# Altium footprint library Connector_PinHeader_2.00mm.PcbLib: 278 footprints (part 14 of 18)
Each footprint in its own frame and in the unit in brackets; x right, y up, seen from the top. Pads: shape width x height; smd on the part's side, far side on the other; paste and mask are expansions set on the pad; w line width, h text height; cw(c..) or ccw(c..) is an arc to the next point about the centre after c.
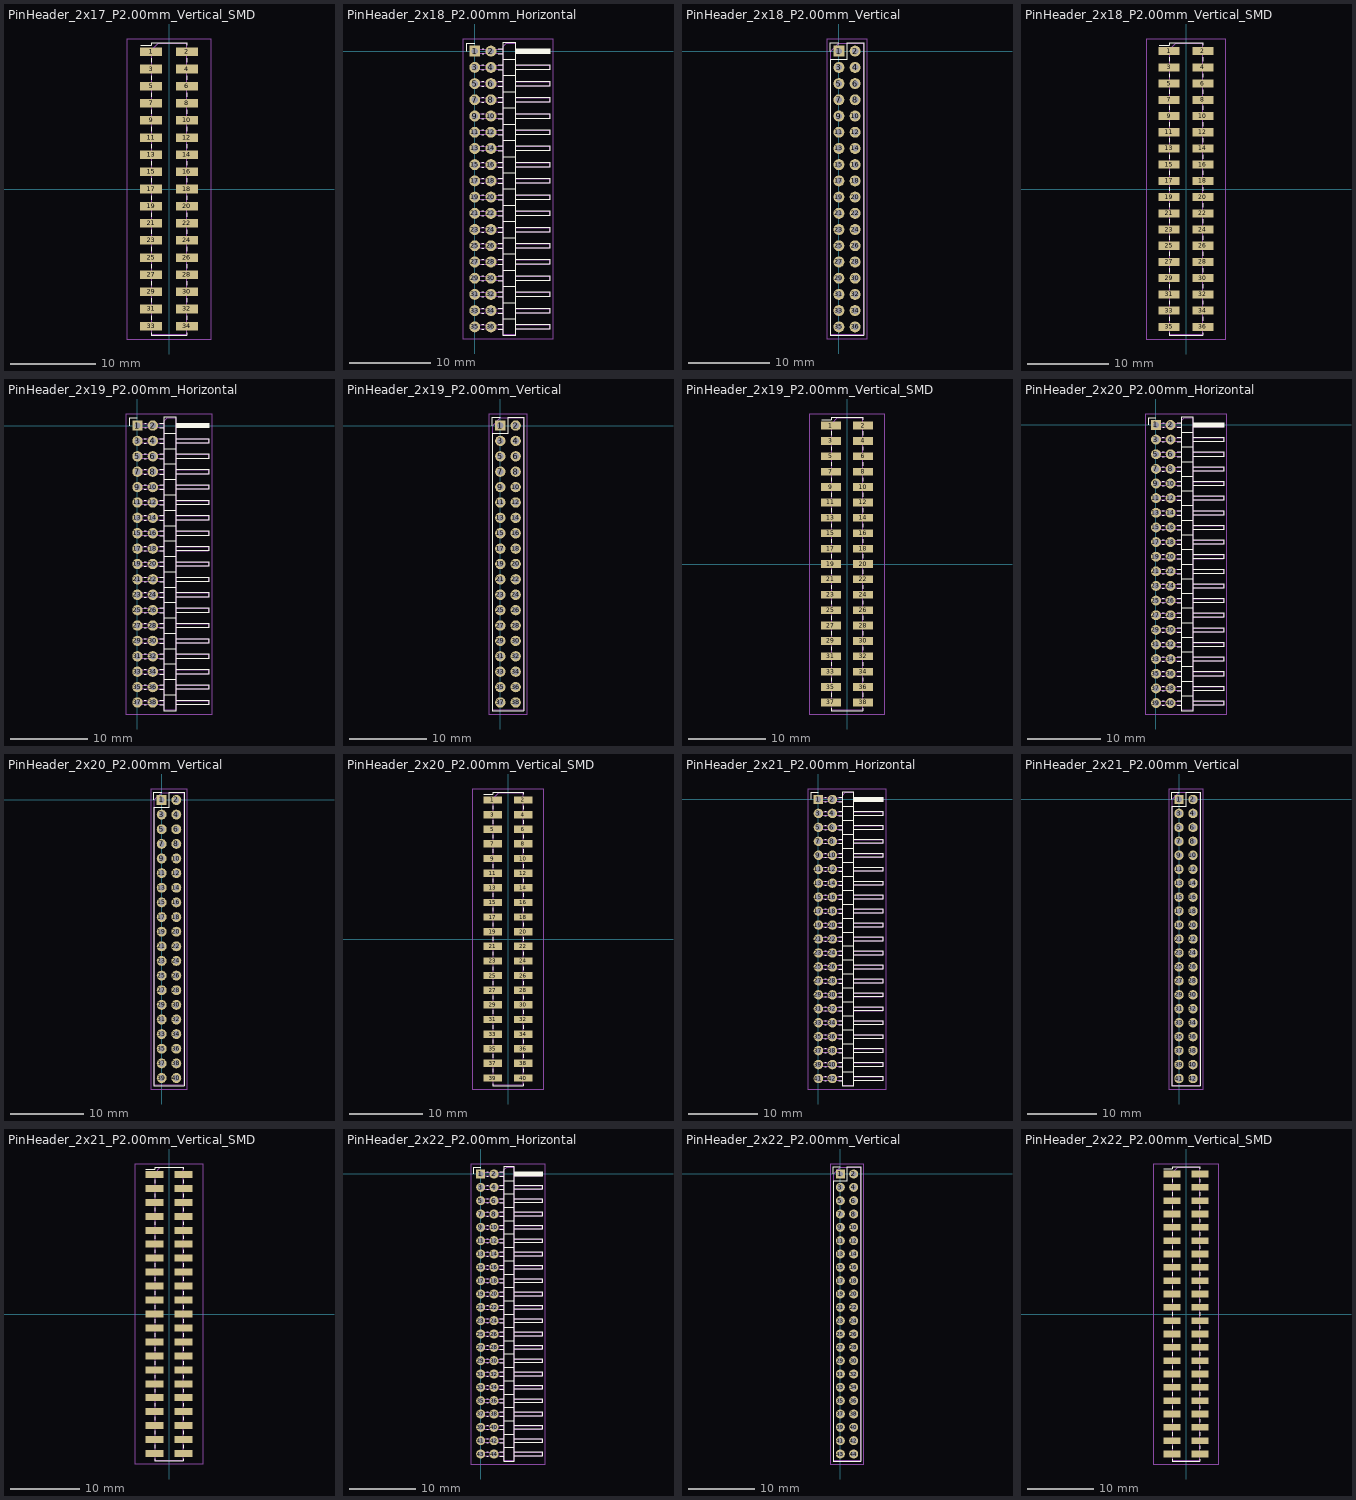
[diagram p13: the footprints below, top view; thin cyan lines are the x and y axes]

## PinHeader_2x17_P2.00mm_Vertical_SMD [mm]
pads (34):
  rect 2.58x1 smd: 1(-2.085,16) 2(2.085,16) 3(-2.085,14) 4(2.085,14) 5(-2.085,12) 6(2.085,12) 7(-2.085,10) 8(2.085,10) 9(-2.085,8) 10(2.085,8) 11(-2.085,6) 12(2.085,6) 13(-2.085,4) 14(2.085,4) 15(-2.085,2) 16(2.085,2) 17(-2.085,0) 18(2.085,0) 19(-2.085,-2) 20(2.085,-2) 21(-2.085,-4) 22(2.085,-4) 23(-2.085,-6) 24(2.085,-6) 25(-2.085,-8) 26(2.085,-8) 27(-2.085,-10) 28(2.085,-10) 29(-2.085,-12) 30(2.085,-12) 31(-2.085,-14) 32(2.085,-14) 33(-2.085,-16) 34(2.085,-16)
F.SilkS:
  lines w0.12: -3.315,16.76 -2.06,16.76 -2.06,17.06 2.06,17.06 2.06,16.76 ; -2.06,-16.76 -2.06,-17.06 2.06,-17.06 2.06,-16.76 ; -2.06,-15.24 -2.06,-14.76 ; -2.06,-13.24 -2.06,-12.76 ; -2.06,-11.24 -2.06,-10.76 ; -2.06,-9.24 -2.06,-8.76 ; -2.06,-7.24 -2.06,-6.76 ; -2.06,-5.24 -2.06,-4.76 ; -2.06,-3.24 -2.06,-2.76 ; -2.06,-1.24 -2.06,-0.76 ; -2.06,0.76 -2.06,1.24 ; -2.06,2.76 -2.06,3.24 ; -2.06,4.76 -2.06,5.24 ; -2.06,6.76 -2.06,7.24 ; -2.06,8.76 -2.06,9.24 ; -2.06,10.76 -2.06,11.24 ; -2.06,12.76 -2.06,13.24 ; -2.06,14.76 -2.06,15.24 ; 2.06,-15.24 2.06,-14.76 ; 2.06,-13.24 2.06,-12.76 ; 2.06,-11.24 2.06,-10.76 ; 2.06,-9.24 2.06,-8.76 ; 2.06,-7.24 2.06,-6.76 ; 2.06,-5.24 2.06,-4.76 ; 2.06,-3.24 2.06,-2.76 ; 2.06,-1.24 2.06,-0.76 ; 2.06,0.76 2.06,1.24 ; 2.06,2.76 2.06,3.24 ; 2.06,4.76 2.06,5.24 ; 2.06,6.76 2.06,7.24 ; 2.06,8.76 2.06,9.24 ; 2.06,10.76 2.06,11.24 ; 2.06,12.76 2.06,13.24 ; 2.06,14.76 2.06,15.24
F.CrtYd:
  lines w0.05: -4.9,-17.5 4.9,-17.5 4.9,17.5 -4.9,17.5 -4.9,-17.5
F.Fab:
  lines w0.1: -2,-16.25 -2.875,-16.25 -2.875,-15.75 -2,-15.75 ; -2,-14.25 -2.875,-14.25 -2.875,-13.75 -2,-13.75 ; -2,-12.25 -2.875,-12.25 -2.875,-11.75 -2,-11.75 ; -2,-10.25 -2.875,-10.25 -2.875,-9.75 -2,-9.75 ; -2,-8.25 -2.875,-8.25 -2.875,-7.75 -2,-7.75 ; -2,-6.25 -2.875,-6.25 -2.875,-5.75 -2,-5.75 ; -2,-4.25 -2.875,-4.25 -2.875,-3.75 -2,-3.75 ; -2,-2.25 -2.875,-2.25 -2.875,-1.75 -2,-1.75 ; -2,-0.25 -2.875,-0.25 -2.875,0.25 -2,0.25 ; -2,1.75 -2.875,1.75 -2.875,2.25 -2,2.25 ; -2,3.75 -2.875,3.75 -2.875,4.25 -2,4.25 ; -2,5.75 -2.875,5.75 -2.875,6.25 -2,6.25 ; -2,7.75 -2.875,7.75 -2.875,8.25 -2,8.25 ; -2,9.75 -2.875,9.75 -2.875,10.25 -2,10.25 ; -2,11.75 -2.875,11.75 -2.875,12.25 -2,12.25 ; -2,13.75 -2.875,13.75 -2.875,14.25 -2,14.25 ; -2,15.75 -2.875,15.75 -2.875,16.25 -2,16.25 ; 2,-16.25 2.875,-16.25 2.875,-15.75 2,-15.75 ; 2,-14.25 2.875,-14.25 2.875,-13.75 2,-13.75 ; 2,-12.25 2.875,-12.25 2.875,-11.75 2,-11.75 ; 2,-10.25 2.875,-10.25 2.875,-9.75 2,-9.75 ; 2,-8.25 2.875,-8.25 2.875,-7.75 2,-7.75 ; 2,-6.25 2.875,-6.25 2.875,-5.75 2,-5.75 ; 2,-4.25 2.875,-4.25 2.875,-3.75 2,-3.75 ; 2,-2.25 2.875,-2.25 2.875,-1.75 2,-1.75 ; 2,-0.25 2.875,-0.25 2.875,0.25 2,0.25 ; 2,1.75 2.875,1.75 2.875,2.25 2,2.25 ; 2,3.75 2.875,3.75 2.875,4.25 2,4.25 ; 2,5.75 2.875,5.75 2.875,6.25 2,6.25 ; 2,7.75 2.875,7.75 2.875,8.25 2,8.25 ; 2,9.75 2.875,9.75 2.875,10.25 2,10.25 ; 2,11.75 2.875,11.75 2.875,12.25 2,12.25 ; 2,13.75 2.875,13.75 2.875,14.25 2,14.25 ; 2,15.75 2.875,15.75 2.875,16.25 2,16.25 ; -2,16.25 -2,-17 2,-17 2,17 -1.25,17 -2,16.25
  text "'.Designator'" at 0.84,-4.047 h1

## PinHeader_2x18_P2.00mm_Horizontal [mm]
pads (36):
  rect 1.35x1.35 hole 0.8: 1(0,0)
  rrect100% 1.35x1.35 hole 0.8: 2(2,0) 3(0,-2) 4(2,-2) 5(0,-4) 6(2,-4) 7(0,-6) 8(2,-6) 9(0,-8) 10(2,-8) 11(0,-10) 12(2,-10) 13(0,-12) 14(2,-12) 15(0,-14) 16(2,-14) 17(0,-16) 18(2,-16) 19(0,-18) 20(2,-18) 21(0,-20) 22(2,-20) 23(0,-22) 24(2,-22) 25(0,-24) 26(2,-24) 27(0,-26) 28(2,-26) 29(0,-28) 30(2,-28) 31(0,-30) 32(2,-30) 33(0,-32) 34(2,-32) 35(0,-34) 36(2,-34)
F.SilkS:
  drawing of 154 lines, arcs and shapes, not listed
F.CrtYd:
  lines w0.05: -1.5,-35.5 9.7,-35.5 9.7,1.5 -1.5,1.5 -1.5,-35.5
F.Fab:
  lines w0.1: 3.5,-34.25 -0.25,-34.25 -0.25,-33.75 3.5,-33.75 ; 3.5,-32.25 -0.25,-32.25 -0.25,-31.75 3.5,-31.75 ; 3.5,-30.25 -0.25,-30.25 -0.25,-29.75 3.5,-29.75 ; 3.5,-28.25 -0.25,-28.25 -0.25,-27.75 3.5,-27.75 ; 3.5,-26.25 -0.25,-26.25 -0.25,-25.75 3.5,-25.75 ; 3.5,-24.25 -0.25,-24.25 -0.25,-23.75 3.5,-23.75 ; 3.5,-22.25 -0.25,-22.25 -0.25,-21.75 3.5,-21.75 ; 3.5,-20.25 -0.25,-20.25 -0.25,-19.75 3.5,-19.75 ; 3.5,-18.25 -0.25,-18.25 -0.25,-17.75 3.5,-17.75 ; 3.5,-16.25 -0.25,-16.25 -0.25,-15.75 3.5,-15.75 ; 3.5,-14.25 -0.25,-14.25 -0.25,-13.75 3.5,-13.75 ; 3.5,-12.25 -0.25,-12.25 -0.25,-11.75 3.5,-11.75 ; 3.5,-10.25 -0.25,-10.25 -0.25,-9.75 3.5,-9.75 ; 3.5,-8.25 -0.25,-8.25 -0.25,-7.75 3.5,-7.75 ; 3.5,-6.25 -0.25,-6.25 -0.25,-5.75 3.5,-5.75 ; 3.5,-4.25 -0.25,-4.25 -0.25,-3.75 3.5,-3.75 ; 3.5,-2.25 -0.25,-2.25 -0.25,-1.75 3.5,-1.75 ; 3.5,-0.25 -0.25,-0.25 -0.25,0.25 3.5,0.25 ; 5,-34.25 9.2,-34.25 9.2,-33.75 5,-33.75 ; 5,-32.25 9.2,-32.25 9.2,-31.75 5,-31.75 ; 5,-30.25 9.2,-30.25 9.2,-29.75 5,-29.75 ; 5,-28.25 9.2,-28.25 9.2,-27.75 5,-27.75 ; 5,-26.25 9.2,-26.25 9.2,-25.75 5,-25.75 ; 5,-24.25 9.2,-24.25 9.2,-23.75 5,-23.75 ; 5,-22.25 9.2,-22.25 9.2,-21.75 5,-21.75 ; 5,-20.25 9.2,-20.25 9.2,-19.75 5,-19.75 ; 5,-18.25 9.2,-18.25 9.2,-17.75 5,-17.75 ; 5,-16.25 9.2,-16.25 9.2,-15.75 5,-15.75 ; 5,-14.25 9.2,-14.25 9.2,-13.75 5,-13.75 ; 5,-12.25 9.2,-12.25 9.2,-11.75 5,-11.75 ; 5,-10.25 9.2,-10.25 9.2,-9.75 5,-9.75 ; 5,-8.25 9.2,-8.25 9.2,-7.75 5,-7.75 ; 5,-6.25 9.2,-6.25 9.2,-5.75 5,-5.75 ; 5,-4.25 9.2,-4.25 9.2,-3.75 5,-3.75 ; 5,-2.25 9.2,-2.25 9.2,-1.75 5,-1.75 ; 5,-0.25 9.2,-0.25 9.2,0.25 5,0.25 ; 3.5,-35 3.5,0.625 3.875,1 5,1 5,-35 3.5,-35
  text "'.Designator'" at 5.006,-20.642 h0.9

## PinHeader_2x18_P2.00mm_Vertical [mm]
pads (36):
  rect 1.35x1.35 hole 0.8: 1(0,0)
  rrect100% 1.35x1.35 hole 0.8: 2(2,0) 3(0,-2) 4(2,-2) 5(0,-4) 6(2,-4) 7(0,-6) 8(2,-6) 9(0,-8) 10(2,-8) 11(0,-10) 12(2,-10) 13(0,-12) 14(2,-12) 15(0,-14) 16(2,-14) 17(0,-16) 18(2,-16) 19(0,-18) 20(2,-18) 21(0,-20) 22(2,-20) 23(0,-22) 24(2,-22) 25(0,-24) 26(2,-24) 27(0,-26) 28(2,-26) 29(0,-28) 30(2,-28) 31(0,-30) 32(2,-30) 33(0,-32) 34(2,-32) 35(0,-34) 36(2,-34)
F.SilkS:
  lines w0.12: -1.06,0 -1.06,1.06 0,1.06 ; -1.06,-35.06 3.06,-35.06 3.06,1.06 1,1.06 1,-1 -1.06,-1 -1.06,-35.06
F.CrtYd:
  lines w0.05: -1.5,-35.5 3.5,-35.5 3.5,1.5 -1.5,1.5 -1.5,-35.5
F.Fab:
  lines w0.1: -1,-35 3,-35 3,1 0,1 -1,0 -1,-35
  text "'.Designator'" at 1.84,-21.047 h1

## PinHeader_2x18_P2.00mm_Vertical_SMD [mm]
pads (36):
  rect 2.58x1 smd: 1(-2.085,17) 2(2.085,17) 3(-2.085,15) 4(2.085,15) 5(-2.085,13) 6(2.085,13) 7(-2.085,11) 8(2.085,11) 9(-2.085,9) 10(2.085,9) 11(-2.085,7) 12(2.085,7) 13(-2.085,5) 14(2.085,5) 15(-2.085,3) 16(2.085,3) 17(-2.085,1) 18(2.085,1) 19(-2.085,-1) 20(2.085,-1) 21(-2.085,-3) 22(2.085,-3) 23(-2.085,-5) 24(2.085,-5) 25(-2.085,-7) 26(2.085,-7) 27(-2.085,-9) 28(2.085,-9) 29(-2.085,-11) 30(2.085,-11) 31(-2.085,-13) 32(2.085,-13) 33(-2.085,-15) 34(2.085,-15) 35(-2.085,-17) 36(2.085,-17)
F.SilkS:
  lines w0.12: -3.315,17.76 -2.06,17.76 -2.06,18.06 2.06,18.06 2.06,17.76 ; -2.06,-17.76 -2.06,-18.06 2.06,-18.06 2.06,-17.76 ; -2.06,-16.24 -2.06,-15.76 ; -2.06,-14.24 -2.06,-13.76 ; -2.06,-12.24 -2.06,-11.76 ; -2.06,-10.24 -2.06,-9.76 ; -2.06,-8.24 -2.06,-7.76 ; -2.06,-6.24 -2.06,-5.76 ; -2.06,-4.24 -2.06,-3.76 ; -2.06,-2.24 -2.06,-1.76 ; -2.06,-0.24 -2.06,0.24 ; -2.06,1.76 -2.06,2.24 ; -2.06,3.76 -2.06,4.24 ; -2.06,5.76 -2.06,6.24 ; -2.06,7.76 -2.06,8.24 ; -2.06,9.76 -2.06,10.24 ; -2.06,11.76 -2.06,12.24 ; -2.06,13.76 -2.06,14.24 ; -2.06,15.76 -2.06,16.24 ; 2.06,-16.24 2.06,-15.76 ; 2.06,-14.24 2.06,-13.76 ; 2.06,-12.24 2.06,-11.76 ; 2.06,-10.24 2.06,-9.76 ; 2.06,-8.24 2.06,-7.76 ; 2.06,-6.24 2.06,-5.76 ; 2.06,-4.24 2.06,-3.76 ; 2.06,-2.24 2.06,-1.76 ; 2.06,-0.24 2.06,0.24 ; 2.06,1.76 2.06,2.24 ; 2.06,3.76 2.06,4.24 ; 2.06,5.76 2.06,6.24 ; 2.06,7.76 2.06,8.24 ; 2.06,9.76 2.06,10.24 ; 2.06,11.76 2.06,12.24 ; 2.06,13.76 2.06,14.24 ; 2.06,15.76 2.06,16.24
F.CrtYd:
  lines w0.05: -4.9,-18.5 4.9,-18.5 4.9,18.5 -4.9,18.5 -4.9,-18.5
F.Fab:
  lines w0.1: -2,-17.25 -2.875,-17.25 -2.875,-16.75 -2,-16.75 ; -2,-15.25 -2.875,-15.25 -2.875,-14.75 -2,-14.75 ; -2,-13.25 -2.875,-13.25 -2.875,-12.75 -2,-12.75 ; -2,-11.25 -2.875,-11.25 -2.875,-10.75 -2,-10.75 ; -2,-9.25 -2.875,-9.25 -2.875,-8.75 -2,-8.75 ; -2,-7.25 -2.875,-7.25 -2.875,-6.75 -2,-6.75 ; -2,-5.25 -2.875,-5.25 -2.875,-4.75 -2,-4.75 ; -2,-3.25 -2.875,-3.25 -2.875,-2.75 -2,-2.75 ; -2,-1.25 -2.875,-1.25 -2.875,-0.75 -2,-0.75 ; -2,0.75 -2.875,0.75 -2.875,1.25 -2,1.25 ; -2,2.75 -2.875,2.75 -2.875,3.25 -2,3.25 ; -2,4.75 -2.875,4.75 -2.875,5.25 -2,5.25 ; -2,6.75 -2.875,6.75 -2.875,7.25 -2,7.25 ; -2,8.75 -2.875,8.75 -2.875,9.25 -2,9.25 ; -2,10.75 -2.875,10.75 -2.875,11.25 -2,11.25 ; -2,12.75 -2.875,12.75 -2.875,13.25 -2,13.25 ; -2,14.75 -2.875,14.75 -2.875,15.25 -2,15.25 ; -2,16.75 -2.875,16.75 -2.875,17.25 -2,17.25 ; 2,-17.25 2.875,-17.25 2.875,-16.75 2,-16.75 ; 2,-15.25 2.875,-15.25 2.875,-14.75 2,-14.75 ; 2,-13.25 2.875,-13.25 2.875,-12.75 2,-12.75 ; 2,-11.25 2.875,-11.25 2.875,-10.75 2,-10.75 ; 2,-9.25 2.875,-9.25 2.875,-8.75 2,-8.75 ; 2,-7.25 2.875,-7.25 2.875,-6.75 2,-6.75 ; 2,-5.25 2.875,-5.25 2.875,-4.75 2,-4.75 ; 2,-3.25 2.875,-3.25 2.875,-2.75 2,-2.75 ; 2,-1.25 2.875,-1.25 2.875,-0.75 2,-0.75 ; 2,0.75 2.875,0.75 2.875,1.25 2,1.25 ; 2,2.75 2.875,2.75 2.875,3.25 2,3.25 ; 2,4.75 2.875,4.75 2.875,5.25 2,5.25 ; 2,6.75 2.875,6.75 2.875,7.25 2,7.25 ; 2,8.75 2.875,8.75 2.875,9.25 2,9.25 ; 2,10.75 2.875,10.75 2.875,11.25 2,11.25 ; 2,12.75 2.875,12.75 2.875,13.25 2,13.25 ; 2,14.75 2.875,14.75 2.875,15.25 2,15.25 ; 2,16.75 2.875,16.75 2.875,17.25 2,17.25 ; -2,17.25 -1.25,18 2,18 2,-18 -2,-18 -2,17.25
  text "'.Designator'" at 0.84,-4.047 h1

## PinHeader_2x19_P2.00mm_Horizontal [mm]
pads (38):
  rect 1.35x1.35 hole 0.8: 1(0,0)
  rrect100% 1.35x1.35 hole 0.8: 2(2,0) 3(0,-2) 4(2,-2) 5(0,-4) 6(2,-4) 7(0,-6) 8(2,-6) 9(0,-8) 10(2,-8) 11(0,-10) 12(2,-10) 13(0,-12) 14(2,-12) 15(0,-14) 16(2,-14) 17(0,-16) 18(2,-16) 19(0,-18) 20(2,-18) 21(0,-20) 22(2,-20) 23(0,-22) 24(2,-22) 25(0,-24) 26(2,-24) 27(0,-26) 28(2,-26) 29(0,-28) 30(2,-28) 31(0,-30) 32(2,-30) 33(0,-32) 34(2,-32) 35(0,-34) 36(2,-34) 37(0,-36) 38(2,-36)
F.SilkS:
  drawing of 162 lines, arcs and shapes, not listed
F.CrtYd:
  lines w0.05: -1.5,-37.5 -1.5,1.5 9.7,1.5 9.7,-37.5 -1.5,-37.5
F.Fab:
  lines w0.1: 3.5,-36.25 -0.25,-36.25 -0.25,-35.75 3.5,-35.75 ; 3.5,-34.25 -0.25,-34.25 -0.25,-33.75 3.5,-33.75 ; 3.5,-32.25 -0.25,-32.25 -0.25,-31.75 3.5,-31.75 ; 3.5,-30.25 -0.25,-30.25 -0.25,-29.75 3.5,-29.75 ; 3.5,-28.25 -0.25,-28.25 -0.25,-27.75 3.5,-27.75 ; 3.5,-26.25 -0.25,-26.25 -0.25,-25.75 3.5,-25.75 ; 3.5,-24.25 -0.25,-24.25 -0.25,-23.75 3.5,-23.75 ; 3.5,-22.25 -0.25,-22.25 -0.25,-21.75 3.5,-21.75 ; 3.5,-20.25 -0.25,-20.25 -0.25,-19.75 3.5,-19.75 ; 3.5,-18.25 -0.25,-18.25 -0.25,-17.75 3.5,-17.75 ; 3.5,-16.25 -0.25,-16.25 -0.25,-15.75 3.5,-15.75 ; 3.5,-14.25 -0.25,-14.25 -0.25,-13.75 3.5,-13.75 ; 3.5,-12.25 -0.25,-12.25 -0.25,-11.75 3.5,-11.75 ; 3.5,-10.25 -0.25,-10.25 -0.25,-9.75 3.5,-9.75 ; 3.5,-8.25 -0.25,-8.25 -0.25,-7.75 3.5,-7.75 ; 3.5,-6.25 -0.25,-6.25 -0.25,-5.75 3.5,-5.75 ; 3.5,-4.25 -0.25,-4.25 -0.25,-3.75 3.5,-3.75 ; 3.5,-2.25 -0.25,-2.25 -0.25,-1.75 3.5,-1.75 ; 3.5,-0.25 -0.25,-0.25 -0.25,0.25 3.5,0.25 ; 5,-36.25 9.2,-36.25 9.2,-35.75 5,-35.75 ; 5,-34.25 9.2,-34.25 9.2,-33.75 5,-33.75 ; 5,-32.25 9.2,-32.25 9.2,-31.75 5,-31.75 ; 5,-30.25 9.2,-30.25 9.2,-29.75 5,-29.75 ; 5,-28.25 9.2,-28.25 9.2,-27.75 5,-27.75 ; 5,-26.25 9.2,-26.25 9.2,-25.75 5,-25.75 ; 5,-24.25 9.2,-24.25 9.2,-23.75 5,-23.75 ; 5,-22.25 9.2,-22.25 9.2,-21.75 5,-21.75 ; 5,-20.25 9.2,-20.25 9.2,-19.75 5,-19.75 ; 5,-18.25 9.2,-18.25 9.2,-17.75 5,-17.75 ; 5,-16.25 9.2,-16.25 9.2,-15.75 5,-15.75 ; 5,-14.25 9.2,-14.25 9.2,-13.75 5,-13.75 ; 5,-12.25 9.2,-12.25 9.2,-11.75 5,-11.75 ; 5,-10.25 9.2,-10.25 9.2,-9.75 5,-9.75 ; 5,-8.25 9.2,-8.25 9.2,-7.75 5,-7.75 ; 5,-6.25 9.2,-6.25 9.2,-5.75 5,-5.75 ; 5,-4.25 9.2,-4.25 9.2,-3.75 5,-3.75 ; 5,-2.25 9.2,-2.25 9.2,-1.75 5,-1.75 ; 5,-0.25 9.2,-0.25 9.2,0.25 5,0.25 ; 3.5,-37 3.5,0.625 3.875,1 5,1 5,-37 3.5,-37
  text "'.Designator'" at 5.006,-21.642 h0.9

## PinHeader_2x19_P2.00mm_Vertical [mm]
pads (38):
  rect 1.35x1.35 hole 0.8: 1(0,0)
  rrect100% 1.35x1.35 hole 0.8: 2(2,0) 3(0,-2) 4(2,-2) 5(0,-4) 6(2,-4) 7(0,-6) 8(2,-6) 9(0,-8) 10(2,-8) 11(0,-10) 12(2,-10) 13(0,-12) 14(2,-12) 15(0,-14) 16(2,-14) 17(0,-16) 18(2,-16) 19(0,-18) 20(2,-18) 21(0,-20) 22(2,-20) 23(0,-22) 24(2,-22) 25(0,-24) 26(2,-24) 27(0,-26) 28(2,-26) 29(0,-28) 30(2,-28) 31(0,-30) 32(2,-30) 33(0,-32) 34(2,-32) 35(0,-34) 36(2,-34) 37(0,-36) 38(2,-36)
F.SilkS:
  lines w0.12: -1.06,0 -1.06,1.06 0,1.06 ; -1.06,-37.06 -1.06,-1 1,-1 1,1.06 3.06,1.06 3.06,-37.06 -1.06,-37.06
F.CrtYd:
  lines w0.05: -1.5,-37.5 -1.5,1.5 3.5,1.5 3.5,-37.5 -1.5,-37.5
F.Fab:
  lines w0.1: -1,-37 3,-37 3,1 0,1 -1,0 -1,-37
  text "'.Designator'" at 1.84,-22.047 h1

## PinHeader_2x19_P2.00mm_Vertical_SMD [mm]
pads (38):
  rect 2.58x1 smd: 1(-2.085,18) 2(2.085,18) 3(-2.085,16) 4(2.085,16) 5(-2.085,14) 6(2.085,14) 7(-2.085,12) 8(2.085,12) 9(-2.085,10) 10(2.085,10) 11(-2.085,8) 12(2.085,8) 13(-2.085,6) 14(2.085,6) 15(-2.085,4) 16(2.085,4) 17(-2.085,2) 18(2.085,2) 19(-2.085,0) 20(2.085,0) 21(-2.085,-2) 22(2.085,-2) 23(-2.085,-4) 24(2.085,-4) 25(-2.085,-6) 26(2.085,-6) 27(-2.085,-8) 28(2.085,-8) 29(-2.085,-10) 30(2.085,-10) 31(-2.085,-12) 32(2.085,-12) 33(-2.085,-14) 34(2.085,-14) 35(-2.085,-16) 36(2.085,-16) 37(-2.085,-18) 38(2.085,-18)
F.SilkS:
  lines w0.12: -3.315,18.76 -2.06,18.76 -2.06,19.06 2.06,19.06 2.06,18.76 ; -2.06,-18.76 -2.06,-19.06 2.06,-19.06 2.06,-18.76 ; -2.06,-17.24 -2.06,-16.76 ; -2.06,-15.24 -2.06,-14.76 ; -2.06,-13.24 -2.06,-12.76 ; -2.06,-11.24 -2.06,-10.76 ; -2.06,-9.24 -2.06,-8.76 ; -2.06,-7.24 -2.06,-6.76 ; -2.06,-5.24 -2.06,-4.76 ; -2.06,-3.24 -2.06,-2.76 ; -2.06,-1.24 -2.06,-0.76 ; -2.06,0.76 -2.06,1.24 ; -2.06,2.76 -2.06,3.24 ; -2.06,4.76 -2.06,5.24 ; -2.06,6.76 -2.06,7.24 ; -2.06,8.76 -2.06,9.24 ; -2.06,10.76 -2.06,11.24 ; -2.06,12.76 -2.06,13.24 ; -2.06,14.76 -2.06,15.24 ; -2.06,16.76 -2.06,17.24 ; 2.06,-17.24 2.06,-16.76 ; 2.06,-15.24 2.06,-14.76 ; 2.06,-13.24 2.06,-12.76 ; 2.06,-11.24 2.06,-10.76 ; 2.06,-9.24 2.06,-8.76 ; 2.06,-7.24 2.06,-6.76 ; 2.06,-5.24 2.06,-4.76 ; 2.06,-3.24 2.06,-2.76 ; 2.06,-1.24 2.06,-0.76 ; 2.06,0.76 2.06,1.24 ; 2.06,2.76 2.06,3.24 ; 2.06,4.76 2.06,5.24 ; 2.06,6.76 2.06,7.24 ; 2.06,8.76 2.06,9.24 ; 2.06,10.76 2.06,11.24 ; 2.06,12.76 2.06,13.24 ; 2.06,14.76 2.06,15.24 ; 2.06,16.76 2.06,17.24
F.CrtYd:
  lines w0.05: -4.9,-19.5 4.9,-19.5 4.9,19.5 -4.9,19.5 -4.9,-19.5
F.Fab:
  lines w0.1: -2,-18.25 -2.875,-18.25 -2.875,-17.75 -2,-17.75 ; -2,-16.25 -2.875,-16.25 -2.875,-15.75 -2,-15.75 ; -2,-14.25 -2.875,-14.25 -2.875,-13.75 -2,-13.75 ; -2,-12.25 -2.875,-12.25 -2.875,-11.75 -2,-11.75 ; -2,-10.25 -2.875,-10.25 -2.875,-9.75 -2,-9.75 ; -2,-8.25 -2.875,-8.25 -2.875,-7.75 -2,-7.75 ; -2,-6.25 -2.875,-6.25 -2.875,-5.75 -2,-5.75 ; -2,-4.25 -2.875,-4.25 -2.875,-3.75 -2,-3.75 ; -2,-2.25 -2.875,-2.25 -2.875,-1.75 -2,-1.75 ; -2,-0.25 -2.875,-0.25 -2.875,0.25 -2,0.25 ; -2,1.75 -2.875,1.75 -2.875,2.25 -2,2.25 ; -2,3.75 -2.875,3.75 -2.875,4.25 -2,4.25 ; -2,5.75 -2.875,5.75 -2.875,6.25 -2,6.25 ; -2,7.75 -2.875,7.75 -2.875,8.25 -2,8.25 ; -2,9.75 -2.875,9.75 -2.875,10.25 -2,10.25 ; -2,11.75 -2.875,11.75 -2.875,12.25 -2,12.25 ; -2,13.75 -2.875,13.75 -2.875,14.25 -2,14.25 ; -2,15.75 -2.875,15.75 -2.875,16.25 -2,16.25 ; -2,17.75 -2.875,17.75 -2.875,18.25 -2,18.25 ; 2,-18.25 2.875,-18.25 2.875,-17.75 2,-17.75 ; 2,-16.25 2.875,-16.25 2.875,-15.75 2,-15.75 ; 2,-14.25 2.875,-14.25 2.875,-13.75 2,-13.75 ; 2,-12.25 2.875,-12.25 2.875,-11.75 2,-11.75 ; 2,-10.25 2.875,-10.25 2.875,-9.75 2,-9.75 ; 2,-8.25 2.875,-8.25 2.875,-7.75 2,-7.75 ; 2,-6.25 2.875,-6.25 2.875,-5.75 2,-5.75 ; 2,-4.25 2.875,-4.25 2.875,-3.75 2,-3.75 ; 2,-2.25 2.875,-2.25 2.875,-1.75 2,-1.75 ; 2,-0.25 2.875,-0.25 2.875,0.25 2,0.25 ; 2,1.75 2.875,1.75 2.875,2.25 2,2.25 ; 2,3.75 2.875,3.75 2.875,4.25 2,4.25 ; 2,5.75 2.875,5.75 2.875,6.25 2,6.25 ; 2,7.75 2.875,7.75 2.875,8.25 2,8.25 ; 2,9.75 2.875,9.75 2.875,10.25 2,10.25 ; 2,11.75 2.875,11.75 2.875,12.25 2,12.25 ; 2,13.75 2.875,13.75 2.875,14.25 2,14.25 ; 2,15.75 2.875,15.75 2.875,16.25 2,16.25 ; 2,17.75 2.875,17.75 2.875,18.25 2,18.25 ; -2,18.25 -2,-19 2,-19 2,19 -1.25,19 -2,18.25
  text "'.Designator'" at 0.84,-4.047 h1

## PinHeader_2x20_P2.00mm_Horizontal [mm]
pads (40):
  rect 1.35x1.35 hole 0.8: 1(0,0)
  rrect100% 1.35x1.35 hole 0.8: 2(2,0) 3(0,-2) 4(2,-2) 5(0,-4) 6(2,-4) 7(0,-6) 8(2,-6) 9(0,-8) 10(2,-8) 11(0,-10) 12(2,-10) 13(0,-12) 14(2,-12) 15(0,-14) 16(2,-14) 17(0,-16) 18(2,-16) 19(0,-18) 20(2,-18) 21(0,-20) 22(2,-20) 23(0,-22) 24(2,-22) 25(0,-24) 26(2,-24) 27(0,-26) 28(2,-26) 29(0,-28) 30(2,-28) 31(0,-30) 32(2,-30) 33(0,-32) 34(2,-32) 35(0,-34) 36(2,-34) 37(0,-36) 38(2,-36) 39(0,-38) 40(2,-38)
F.SilkS:
  drawing of 170 lines, arcs and shapes, not listed
F.CrtYd:
  lines w0.05: -1.5,-39.5 9.7,-39.5 9.7,1.5 -1.5,1.5 -1.5,-39.5
F.Fab:
  lines w0.1: 3.5,-38.25 -0.25,-38.25 -0.25,-37.75 3.5,-37.75 ; 3.5,-36.25 -0.25,-36.25 -0.25,-35.75 3.5,-35.75 ; 3.5,-34.25 -0.25,-34.25 -0.25,-33.75 3.5,-33.75 ; 3.5,-32.25 -0.25,-32.25 -0.25,-31.75 3.5,-31.75 ; 3.5,-30.25 -0.25,-30.25 -0.25,-29.75 3.5,-29.75 ; 3.5,-28.25 -0.25,-28.25 -0.25,-27.75 3.5,-27.75 ; 3.5,-26.25 -0.25,-26.25 -0.25,-25.75 3.5,-25.75 ; 3.5,-24.25 -0.25,-24.25 -0.25,-23.75 3.5,-23.75 ; 3.5,-22.25 -0.25,-22.25 -0.25,-21.75 3.5,-21.75 ; 3.5,-20.25 -0.25,-20.25 -0.25,-19.75 3.5,-19.75 ; 3.5,-18.25 -0.25,-18.25 -0.25,-17.75 3.5,-17.75 ; 3.5,-16.25 -0.25,-16.25 -0.25,-15.75 3.5,-15.75 ; 3.5,-14.25 -0.25,-14.25 -0.25,-13.75 3.5,-13.75 ; 3.5,-12.25 -0.25,-12.25 -0.25,-11.75 3.5,-11.75 ; 3.5,-10.25 -0.25,-10.25 -0.25,-9.75 3.5,-9.75 ; 3.5,-8.25 -0.25,-8.25 -0.25,-7.75 3.5,-7.75 ; 3.5,-6.25 -0.25,-6.25 -0.25,-5.75 3.5,-5.75 ; 3.5,-4.25 -0.25,-4.25 -0.25,-3.75 3.5,-3.75 ; 3.5,-2.25 -0.25,-2.25 -0.25,-1.75 3.5,-1.75 ; 3.5,-0.25 -0.25,-0.25 -0.25,0.25 3.5,0.25 ; 5,-38.25 9.2,-38.25 9.2,-37.75 5,-37.75 ; 5,-36.25 9.2,-36.25 9.2,-35.75 5,-35.75 ; 5,-34.25 9.2,-34.25 9.2,-33.75 5,-33.75 ; 5,-32.25 9.2,-32.25 9.2,-31.75 5,-31.75 ; 5,-30.25 9.2,-30.25 9.2,-29.75 5,-29.75 ; 5,-28.25 9.2,-28.25 9.2,-27.75 5,-27.75 ; 5,-26.25 9.2,-26.25 9.2,-25.75 5,-25.75 ; 5,-24.25 9.2,-24.25 9.2,-23.75 5,-23.75 ; 5,-22.25 9.2,-22.25 9.2,-21.75 5,-21.75 ; 5,-20.25 9.2,-20.25 9.2,-19.75 5,-19.75 ; 5,-18.25 9.2,-18.25 9.2,-17.75 5,-17.75 ; 5,-16.25 9.2,-16.25 9.2,-15.75 5,-15.75 ; 5,-14.25 9.2,-14.25 9.2,-13.75 5,-13.75 ; 5,-12.25 9.2,-12.25 9.2,-11.75 5,-11.75 ; 5,-10.25 9.2,-10.25 9.2,-9.75 5,-9.75 ; 5,-8.25 9.2,-8.25 9.2,-7.75 5,-7.75 ; 5,-6.25 9.2,-6.25 9.2,-5.75 5,-5.75 ; 5,-4.25 9.2,-4.25 9.2,-3.75 5,-3.75 ; 5,-2.25 9.2,-2.25 9.2,-1.75 5,-1.75 ; 5,-0.25 9.2,-0.25 9.2,0.25 5,0.25 ; 3.5,-39 5,-39 5,1 3.875,1 3.5,0.625 3.5,-39